# Altium footprint library pcb.PcbLib: 397 footprints (part 22 of 25)
Each footprint in its own frame and in the unit in brackets; x right, y up, seen from the top. Pads: shape width x height; smd on the part's side, far side on the other; paste and mask are expansions set on the pad; w line width, h text height; cw(c..) or ccw(c..) is an arc to the next point about the centre after c.
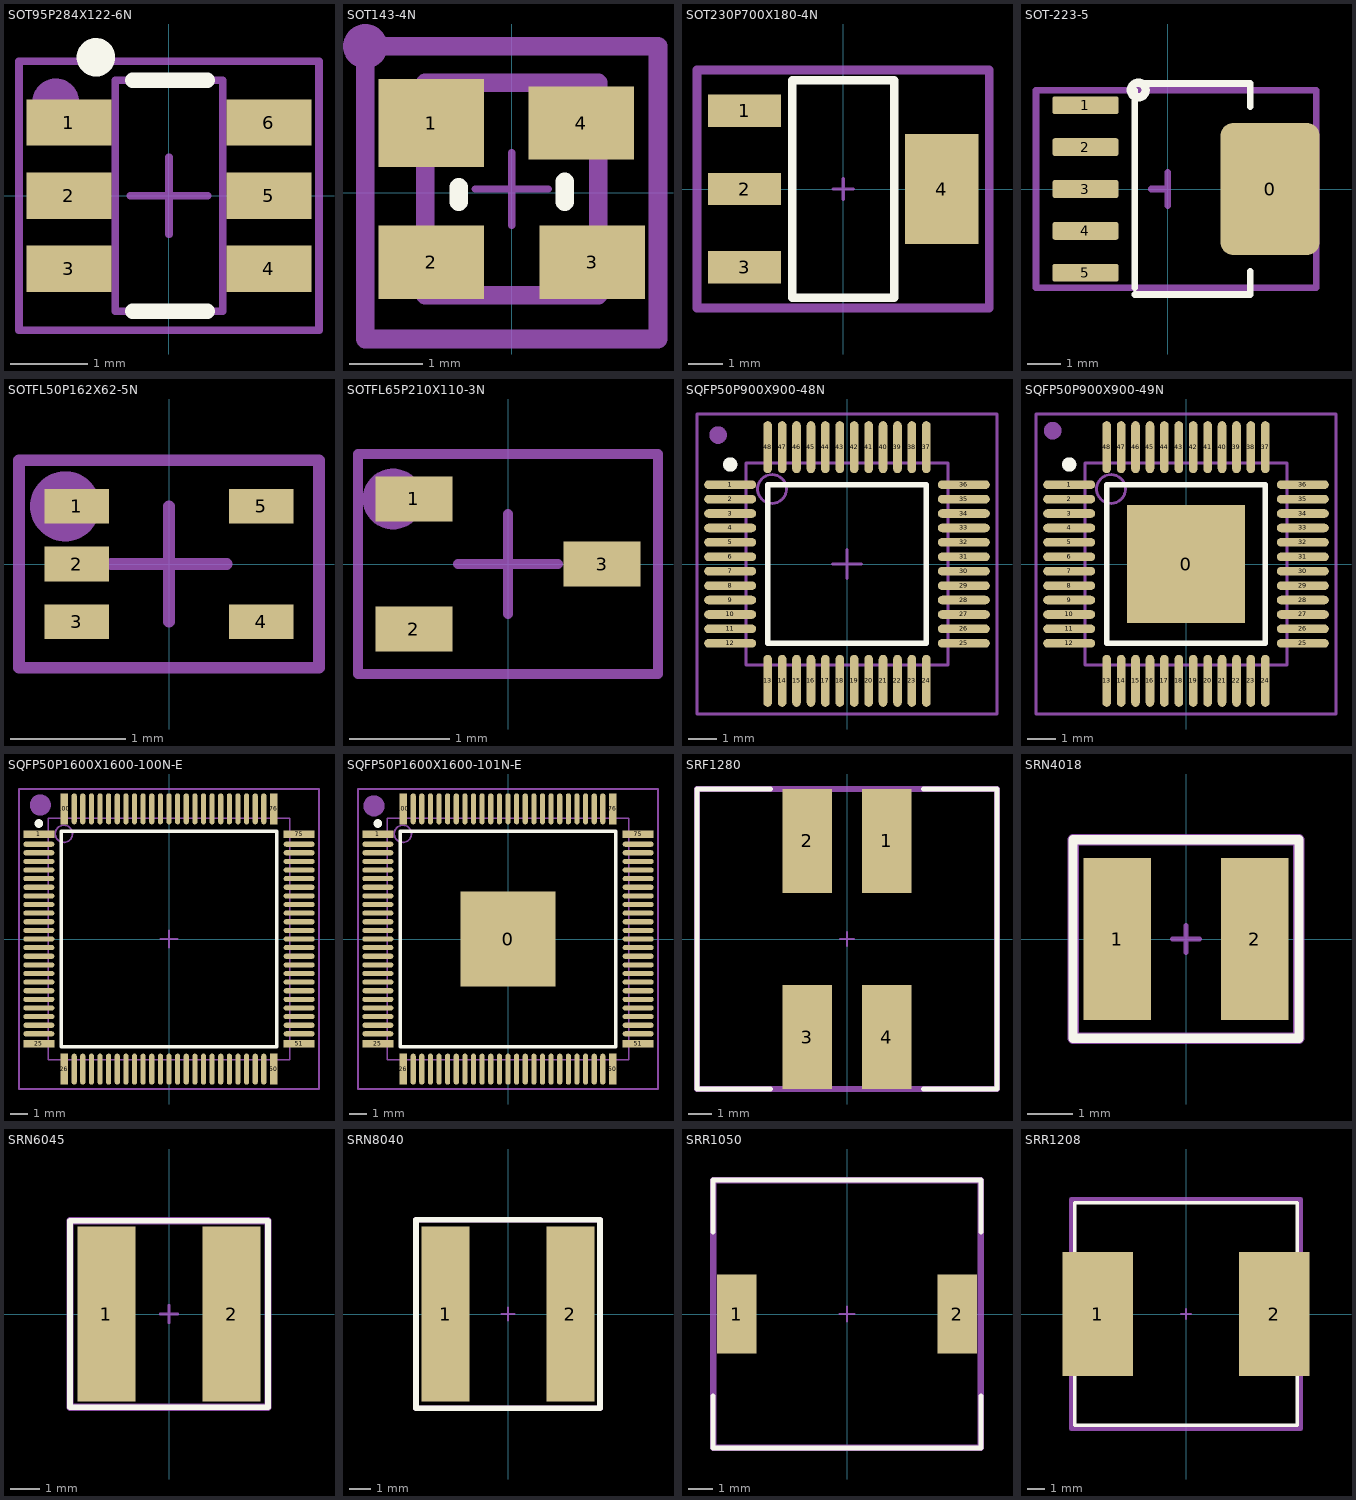
[diagram p21: the footprints below, top view; thin cyan lines are the x and y axes]

## SOT95P284X122-6N [mm] "SOT23, 6-Leads"
height 1.1
pads (6):
  rect 1.1x0.6 smd: 1(-1.3,0.95) 2(-1.3,0) 3(-1.3,-0.95) 4(1.3,-0.95) 5(1.3,0) 6(1.3,0.95)
Top Overlay:
  circle w0.25: c-0.95,1.8 r0.125
  lines w0.2: -0.475,-1.5 0.5,-1.5 ; -0.475,1.5 0.5,1.5
Mechanical 13:
  lines w0.1: -0.7,-1.5 0.7,-1.5 0.7,1.5 -0.7,1.5 -0.7,-1.5
Mechanical 15:
  circle w0.406: c-1.472,1.219 r0.1
  lines w0.1: -0.5,0 0.5,0 ; 0,-0.5 0,0.5 ; -1.95,-1.75 1.95,-1.75 1.95,1.75 -1.95,1.75 -1.95,-1.75
  text ".Designator" at -1.55,-1.321 h0.51
3D body: height 1.1, standoff 0, extent -0.7,-1.5 0.7,1.5

## SOT143-4N [mm] "4-Pin SOT-143 (M4)"
height 1.12
pads (4):
  rect 1.44x1.2 smd: 1(-1.1,0.95)
  rect 1.44x1 smd: 2(-1.1,-0.95) 3(1.1,-0.95) 4(0.95,0.95)
Top Overlay:
  lines w0.254: -0.725,-0.125 -0.725,0.075 ; 0.725,-0.125 0.725,0.15
Mechanical 13:
  lines w0.254: -1.182,-1.4 -1.182,1.5 1.181,1.5 1.181,-1.4 -1.182,-1.4
Mechanical 15:
  circle w0.406: c-2,2 r0.1
  lines w0.1: -0.5,0.05 0.5,0.05 ; 0,-0.45 0,0.55
  lines w0.254: -2,-2 -2,2 2,2 2,-2 -2,-2
  text ".Designator" at -2.2,-3.3 h1.02
3D body "User Library-SOT143-1.STEP": height 1.22, standoff 0, extent -1.182,-1.4 1.181,1.5

## SOT230P700X180-4N [mm] "SOT223-3/TO-261AA; SOT,2.30mm,pitch;4 pin,3.50mm W X 6.50mm L X 1.80mm H body"
height 2
pads (4):
  rect 2.15x0.95 smd: 1(-2.9,2.3) 2(-2.9,0) 3(-2.9,-2.3)
  rect 2.15x3.25 smd: 4(2.9,0)
Top Overlay:
  lines w0.254: -1.5,-3.2 -1.5,3.2 1.5,3.2 1.5,-3.2 -1.5,-3.2
Mechanical 15:
  lines w0.1: -0.3,0 0.3,0 ; 0,-0.3 0,0.3
  lines w0.254: -4.3,-3.5 4.3,-3.5 4.3,3.5 -4.3,3.5 -4.3,-3.5
  text ".Designator" at -3.7,-2.8 h1.02
3D body: height 1, standoff 0, extent -1.8,-3.3 1.8,3.3

## SOT-223-5 [mm] "SOT-223-5 lead"
pads (6):
  rrect25% 3x4 smd: 0(3.1,0)
  rrect25% 2x0.54 smd: 1(-2.5,2.54) 2(-2.5,1.27) 3(-2.5,0) 4(-2.5,-1.27) 5(-2.5,-2.54)
Top Overlay:
  circle w0.254: c-0.9,3 r0.224
  lines w0.2: -1,-3.2 1.5,-3.2 2.5,-3.2 2.5,-2.5 ; -1,-3 -1,3 ; -1,3.2 1.5,3.2 2.5,3.2 2.5,2.5
Mechanical 15:
  lines w0.2: -0.5,0 0,0 ; 0,-0.5 0,0.5 ; -4,-3 -4,3 4.5,3 4.5,-3 -4,-3
3D body "SOT-223_5MC-M.step": height 1.8, standoff 0, extent -3.23,-3.275 4.03,3.275

## SOTFL50P162X62-5N [mm] "SOTFL,0.50mm,pitch;5 pin,1.175mm W X 1.60mm L X 0.62mm H body"
height 0.62
pads (5):
  rect 0.56x0.3 smd: 1(-0.8,0.5) 2(-0.8,0) 3(-0.8,-0.5) 4(0.8,-0.5) 5(0.8,0.5)
Mechanical 15:
  circle w0.406: c-0.9,0.5 r0.1
  lines w0.1: -0.5,0 0.5,0 ; 0,-0.5 0,0.5 ; -1.3,-0.9 -1.3,0.9 1.3,0.9 1.3,-0.9 -1.3,-0.9
  text ".Designator" at -1.1,-0.7 h0.51
3D body: height 0.62, standoff 0, extent -0.8,-0.8 0.8,0.8

## SOTFL65P210X110-3N [mm] "SOT323FL, 0.65mm,pitch;3 pin,1.25mm W X 2.00mm L X 1.10mm H body"
height 1.1
pads (3):
  rect 0.77x0.45 smd: 1(-0.94,0.65) 2(-0.94,-0.65) 3(0.94,0)
Mechanical 15:
  circle w0.406: c-1.15,0.65 r0.1
  lines w0.1: -0.5,0 0.5,0 ; 0,-0.5 0,0.5 ; -1.5,-1.1 1.5,-1.1 1.5,1.1 -1.5,1.1 -1.5,-1.1
  text ".Designator" at -1.422,-0.864 h0.51
3D body: height 1.1, standoff 0, extent -0.625,-1 0.625,1

## SQFP50P900X900-48N [mm] "Shrink QFP, 48-Leads, Body 7x7mm, Pitch 0.5mm, IPC Medium Density"
height 1.7
pads (48):
  oval 1.8x0.3 smd: 1(-4.05,2.75) 2(-4.05,2.25) 3(-4.05,1.75) 4(-4.05,1.25) 5(-4.05,0.75) 6(-4.05,0.25) 7(-4.05,-0.25) 8(-4.05,-0.75) 9(-4.05,-1.25) 10(-4.05,-1.75) 11(-4.05,-2.25) 12(-4.05,-2.75) 25(4.05,-2.75) 26(4.05,-2.25) 27(4.05,-1.75) 28(4.05,-1.25) 29(4.05,-0.75) 30(4.05,-0.25) 31(4.05,0.25) 32(4.05,0.75) 33(4.05,1.25) 34(4.05,1.75) 35(4.05,2.25) 36(4.05,2.75)
  oval 0.3x1.8 smd: 13(-2.75,-4.05) 14(-2.25,-4.05) 15(-1.75,-4.05) 16(-1.25,-4.05) 17(-0.75,-4.05) 18(-0.25,-4.05) 19(0.25,-4.05) 20(0.75,-4.05) 21(1.25,-4.05) 22(1.75,-4.05) 23(2.25,-4.05) 24(2.75,-4.05) 37(2.75,4.05) 38(2.25,4.05) 39(1.75,4.05) 40(1.25,4.05) 41(0.75,4.05) 42(0.25,4.05) 43(-0.25,4.05) 44(-0.75,4.05) 45(-1.25,4.05) 46(-1.75,4.05) 47(-2.25,4.05) 48(-2.75,4.05)
Top Overlay:
  circle w0.25: c-4.05,3.45 r0.125
  lines w0.2: -2.75,-2.75 2.75,-2.75 2.75,2.75 -2.75,2.75 -2.75,-2.75
Mechanical 13:
  circle w0.1: c-2.6,2.6 r0.5
  lines w0.1: -3.5,-3.5 3.5,-3.5 3.5,3.5 -3.5,3.5 -3.5,-3.5
Mechanical 15:
  circle w0.406: c-4.469,4.47 r0.1
  lines w0.1: -0.5,0 0.5,0 ; 0,-0.5 0,0.5 ; -5.2,-5.2 5.2,-5.2 5.2,5.2 -5.2,5.2 -5.2,-5.2
  text ".Designator" at -4.465,1.148 h1.02
3D body: height 1.7, standoff 0, extent -3.5,-3.5 3.5,3.5

## SQFP50P900X900-49N [mm] "Shrink QFP, 48-Leads, Body 7x7mm, Pitch 0.5mm, IPC Medium Density"
height 1.7
pads (49):
  rect 4.1x4.1 smd paste-1000: 0(0,0)
  oval 1.8x0.3 smd: 1(-4.05,2.75) 2(-4.05,2.25) 3(-4.05,1.75) 4(-4.05,1.25) 5(-4.05,0.75) 6(-4.05,0.25) 7(-4.05,-0.25) 8(-4.05,-0.75) 9(-4.05,-1.25) 10(-4.05,-1.75) 11(-4.05,-2.25) 12(-4.05,-2.75) 25(4.05,-2.75) 26(4.05,-2.25) 27(4.05,-1.75) 28(4.05,-1.25) 29(4.05,-0.75) 30(4.05,-0.25) 31(4.05,0.25) 32(4.05,0.75) 33(4.05,1.25) 34(4.05,1.75) 35(4.05,2.25) 36(4.05,2.75)
  oval 0.3x1.8 smd: 13(-2.75,-4.05) 14(-2.25,-4.05) 15(-1.75,-4.05) 16(-1.25,-4.05) 17(-0.75,-4.05) 18(-0.25,-4.05) 19(0.25,-4.05) 20(0.75,-4.05) 21(1.25,-4.05) 22(1.75,-4.05) 23(2.25,-4.05) 24(2.75,-4.05) 37(2.75,4.05) 38(2.25,4.05) 39(1.75,4.05) 40(1.25,4.05) 41(0.75,4.05) 42(0.25,4.05) 43(-0.25,4.05) 44(-0.75,4.05) 45(-1.25,4.05) 46(-1.75,4.05) 47(-2.25,4.05) 48(-2.75,4.05)
Top Overlay:
  circle w0.25: c-4.05,3.45 r0.125
  lines w0.2: -2.75,-2.75 -2.75,2.75 2.75,2.75 2.75,-2.75 -2.75,-2.75
Top Paste:
  rectangle: 0.152,0.152 1.852,1.852
  rectangle: 0.152,-1.829 1.852,-0.129
  rectangle: -1.88,0.152 -0.18,1.852
  rectangle: -1.88,-1.829 -0.18,-0.129
Mechanical 13:
  circle w0.1: c-2.6,2.6 r0.5
  lines w0.1: -3.5,-3.5 -3.5,3.5 3.5,3.5 3.5,-3.5 -3.5,-3.5
Mechanical 15:
  circle w0.406: c-4.621,4.623 r0.1
  lines w0.1: -0.5,0 0.5,0 ; 0,-0.5 0,0.5 ; -5.2,-5.2 -5.2,5.2 5.2,5.2 5.2,-5.2 -5.2,-5.2
  text ".Designator" at -1.773,1.148 h1.02
3D body: height 1.7, standoff 0, extent -3.5,-3.5 3.5,3.5

## SQFP50P1600X1600-100N-E [mm] "Shrink QFP, 100-Leads, Body 14x14mm, Pitch 0.5mm, IPC Medium Density"
height 2.2
pads (100):
  rect 1.8x0.45 smd: 1(-7.55,6.075) 25(-7.55,-6.075) 51(7.55,-6.075) 75(7.55,6.075)
  oval 1.8x0.3 smd: 2(-7.55,5.5) 3(-7.55,5) 4(-7.55,4.5) 5(-7.55,4) 6(-7.55,3.5) 7(-7.55,3) 8(-7.55,2.5) 9(-7.55,2) 10(-7.55,1.5) 11(-7.55,1) 12(-7.55,0.5) 13(-7.55,0) 14(-7.55,-0.5) 15(-7.55,-1) 16(-7.55,-1.5) 17(-7.55,-2) 18(-7.55,-2.5) 19(-7.55,-3) 20(-7.55,-3.5) 21(-7.55,-4) 22(-7.55,-4.5) 23(-7.55,-5) 24(-7.55,-5.5) 52(7.55,-5.5) 53(7.55,-5) 54(7.55,-4.5) 55(7.55,-4) 56(7.55,-3.5) 57(7.55,-3) 58(7.55,-2.5) 59(7.55,-2) 60(7.55,-1.5) 61(7.55,-1) 62(7.55,-0.5) 63(7.55,0) 64(7.55,0.5) 65(7.55,1) 66(7.55,1.5) 67(7.55,2) 68(7.55,2.5) 69(7.55,3) 70(7.55,3.5) 71(7.55,4) 72(7.55,4.5) 73(7.55,5) 74(7.55,5.5)
  rect 0.45x1.8 smd: 26(-6.075,-7.55) 50(6.075,-7.55) 76(6.075,7.55) 100(-6.075,7.55)
  oval 0.3x1.8 smd: 27(-5.5,-7.55) 28(-5,-7.55) 29(-4.5,-7.55) 30(-4,-7.55) 31(-3.5,-7.55) 32(-3,-7.55) 33(-2.5,-7.55) 34(-2,-7.55) 35(-1.5,-7.55) 36(-1,-7.55) 37(-0.5,-7.55) 38(0,-7.55) 39(0.5,-7.55) 40(1,-7.55) 41(1.5,-7.55) 42(2,-7.55) 43(2.5,-7.55) 44(3,-7.55) 45(3.5,-7.55) 46(4,-7.55) 47(4.5,-7.55) 48(5,-7.55) 49(5.5,-7.55) 77(5.5,7.55) 78(5,7.55) 79(4.5,7.55) 80(4,7.55) 81(3.5,7.55) 82(3,7.55) 83(2.5,7.55) 84(2,7.55) 85(1.5,7.55) 86(1,7.55) 87(0.5,7.55) 88(0,7.55) 89(-0.5,7.55) 90(-1,7.55) 91(-1.5,7.55) 92(-2,7.55) 93(-2.5,7.55) 94(-3,7.55) 95(-3.5,7.55) 96(-4,7.55) 97(-4.5,7.55) 98(-5,7.55) 99(-5.5,7.55)
Top Overlay:
  circle w0.25: c-7.55,6.7 r0.125
  lines w0.2: -6.25,-6.25 -6.25,6.25 6.25,6.25 6.25,-6.25 -6.25,-6.25
Mechanical 13:
  circle w0.1: c-6.1,6.1 r0.5
  lines w0.1: -7,-7 -7,7 7,7 7,-7 -7,-7
Mechanical 15:
  circle w1.016: c-7.466,7.772 r0.1
  lines w0.1: -0.5,0 0.5,0 ; 0,-0.5 0,0.5 ; -8.7,-8.7 -8.7,8.7 8.7,8.7 8.7,-8.7 -8.7,-8.7
  text ".Designator" at -2.789,0.996 h1.02
3D body: height 1.6, standoff 0, extent -7,-7 7,7

## SQFP50P1600X1600-101N-E [mm] "Shrink QFP, 100-Leads, Body 14x14mm, Pitch 0.5mm, IPC Medium Density"
height 2.2
pads (101):
  rect 5.5x5.5 smd paste-1000: 0(0,0)
  rect 1.8x0.45 smd: 1(-7.55,6.075) 25(-7.55,-6.075) 51(7.55,-6.075) 75(7.55,6.075)
  oval 1.8x0.3 smd: 2(-7.55,5.5) 3(-7.55,5) 4(-7.55,4.5) 5(-7.55,4) 6(-7.55,3.5) 7(-7.55,3) 8(-7.55,2.5) 9(-7.55,2) 10(-7.55,1.5) 11(-7.55,1) 12(-7.55,0.5) 13(-7.55,0) 14(-7.55,-0.5) 15(-7.55,-1) 16(-7.55,-1.5) 17(-7.55,-2) 18(-7.55,-2.5) 19(-7.55,-3) 20(-7.55,-3.5) 21(-7.55,-4) 22(-7.55,-4.5) 23(-7.55,-5) 24(-7.55,-5.5) 52(7.55,-5.5) 53(7.55,-5) 54(7.55,-4.5) 55(7.55,-4) 56(7.55,-3.5) 57(7.55,-3) 58(7.55,-2.5) 59(7.55,-2) 60(7.55,-1.5) 61(7.55,-1) 62(7.55,-0.5) 63(7.55,0) 64(7.55,0.5) 65(7.55,1) 66(7.55,1.5) 67(7.55,2) 68(7.55,2.5) 69(7.55,3) 70(7.55,3.5) 71(7.55,4) 72(7.55,4.5) 73(7.55,5) 74(7.55,5.5)
  rect 0.45x1.8 smd: 26(-6.075,-7.55) 50(6.075,-7.55) 76(6.075,7.55) 100(-6.075,7.55)
  oval 0.3x1.8 smd: 27(-5.5,-7.55) 28(-5,-7.55) 29(-4.5,-7.55) 30(-4,-7.55) 31(-3.5,-7.55) 32(-3,-7.55) 33(-2.5,-7.55) 34(-2,-7.55) 35(-1.5,-7.55) 36(-1,-7.55) 37(-0.5,-7.55) 38(0,-7.55) 39(0.5,-7.55) 40(1,-7.55) 41(1.5,-7.55) 42(2,-7.55) 43(2.5,-7.55) 44(3,-7.55) 45(3.5,-7.55) 46(4,-7.55) 47(4.5,-7.55) 48(5,-7.55) 49(5.5,-7.55) 77(5.5,7.55) 78(5,7.55) 79(4.5,7.55) 80(4,7.55) 81(3.5,7.55) 82(3,7.55) 83(2.5,7.55) 84(2,7.55) 85(1.5,7.55) 86(1,7.55) 87(0.5,7.55) 88(0,7.55) 89(-0.5,7.55) 90(-1,7.55) 91(-1.5,7.55) 92(-2,7.55) 93(-2.5,7.55) 94(-3,7.55) 95(-3.5,7.55) 96(-4,7.55) 97(-4.5,7.55) 98(-5,7.55) 99(-5.5,7.55)
Top Overlay:
  circle w0.25: c-7.55,6.7 r0.125
  lines w0.2: -6.25,-6.25 6.25,-6.25 6.25,6.25 -6.25,6.25 -6.25,-6.25
Top Paste:
  rectangle: -2.438,0.254 -0.238,2.454
  rectangle: -2.438,-2.438 -0.238,-0.238
  rectangle: 0.203,-2.438 2.403,-0.238
  rectangle: 0.238,0.254 2.438,2.454
Mechanical 13:
  circle w0.1: c-6.1,6.1 r0.5
  lines w0.1: -7,-7 7,-7 7,7 -7,7 -7,-7
Mechanical 15:
  circle w1.016: c-7.771,7.722 r0.1
  lines w0.1: -0.5,0 0.5,0 ; 0,-0.5 0,0.5 ; -8.7,-8.7 8.7,-8.7 8.7,8.7 -8.7,8.7 -8.7,-8.7
  text ".Designator" at -4.313,1.25 h1.02
3D body: height 2.2, standoff 0, extent -7,-7 7,7

## SRF1280 [mm]
height 8
pads (4):
  rect 2.15x4.5 smd: 1(1.715,4.25) 2(-1.715,4.25) 3(-1.715,-4.25) 4(1.715,-4.25)
Top Overlay:
  lines w0.2: -3.3,-6.5 -6.5,-6.5 -6.5,6.5 -3.3,6.5 ; 3.3,-6.5 6.5,-6.5 6.5,6.5 3.3,6.5
Mechanical 15:
  lines w0.1: -0.3,0 0.3,0 ; 0,-0.3 0,0.3
  lines w0.254: -6.5,-6.5 6.5,-6.5 6.5,6.5 -6.5,6.5 -6.5,-6.5
  text ".Designator" at -4.775,2.743 h1.02
3D body: height 6, standoff 0, extent -6.25,-6.25 6.25,6.25

## SRN4018 [mm]
height 1.8
pads (2):
  rect 1.5x3.6 smd: 1(-1.525,0) 2(1.525,0)
Top Overlay:
  lines w0.2: -2.5,-2.2 -2.5,2.2 2.5,2.2 2.5,-2.2 -2.5,-2.2
Mechanical 15:
  lines w0.1: -0.3,0 0.3,0 ; 0,-0.3 0,0.3
  lines w0.254: -2.5,-2.2 -2.5,2.2 2.5,2.2 2.5,-2.2 -2.5,-2.2
  text ".Designator" at -1.575,-1.524 h1.02
3D body: height 1.8, standoff 0, extent -2,-2 2,2

## SRN6045 [mm]
height 4.5
pads (2):
  rect 2x6 smd: 1(-2.15,0) 2(2.15,0)
Top Overlay:
  lines w0.2: -3.4,-3.2 3.4,-3.2 3.4,3.2 -3.4,3.2 -3.4,-3.2
Mechanical 15:
  lines w0.1: -0.3,0 0.3,0 ; 0,-0.3 0,0.3
  lines w0.254: -3.4,-3.2 3.4,-3.2 3.4,3.2 -3.4,3.2 -3.4,-3.2
  text ".Designator" at -1.575,-1.524 h1.02
3D body: height 4.5, standoff 0, extent -3,-3 3,3

## SRN8040 [mm]
height 4
pads (2):
  rect 2.2x8 smd: 1(-2.85,0) 2(2.85,0)
Top Overlay:
  lines w0.254: -4.2,-4.3 4.2,-4.3 4.2,4.3 -4.2,4.3 -4.2,-4.3
Mechanical 15:
  lines w0.1: -0.3,0 0.3,0 ; 0,-0.3 0,0.3
  lines w0.254: -4.2,-4.3 4.2,-4.3 4.2,4.3 -4.2,4.3 -4.2,-4.3
  text ".Designator" at -3,-3.5 h1.02
3D body: height 4, standoff 0, extent -4,-4 4,4

## SRR1050 [mm]
height 5.1
pads (2):
  rect 1.6x3.2 smd: 1(-4.45,0) 2(4.45,0)
Top Overlay:
  lines w0.2: -5.4,-3.3 -5.4,-5.4 5.4,-5.4 5.4,-3.3 ; -5.4,3.3 -5.4,5.4 5.4,5.4 5.4,3.3
Mechanical 15:
  lines w0.1: -0.3,0 0.3,0 ; 0,-0.3 0,0.3
  lines w0.254: -5.4,-5.4 5.4,-5.4 5.4,5.4 -5.4,5.4 -5.4,-5.4
  text ".Designator" at -4.775,2.743 h1.02
3D body: height 8.5, standoff 0, extent -5.25,-5.25 5.25,5.25

## SRR1208 [mm]
height 8.5
pads (2):
  rect 4x7 smd: 1(-5,0) 2(5,0)
Top Overlay:
  lines w0.2: -6.3,-3.3 -6.3,-6.3 6.3,-6.3 6.3,-3.3 ; -6.3,3.3 -6.3,6.3 6.3,6.3 6.3,3.3
Mechanical 15:
  lines w0.1: -0.3,0 0.3,0 ; 0,-0.3 0,0.3
  lines w0.254: -6.5,-6.5 6.5,-6.5 6.5,6.5 -6.5,6.5 -6.5,-6.5
  text ".Designator" at -4.775,2.743 h1.02
3D body: height 8.5, standoff 0, extent -6.5,-6.5 6.5,6.5